# Altium footprint library common.PcbLib: 552 footprints (part 17 of 35)
Each footprint in its own frame and in the unit in brackets; x right, y up, seen from the top. Pads: shape width x height; smd on the part's side, far side on the other; paste and mask are expansions set on the pad; w line width, h text height; cw(c..) or ccw(c..) is an arc to the next point about the centre after c.
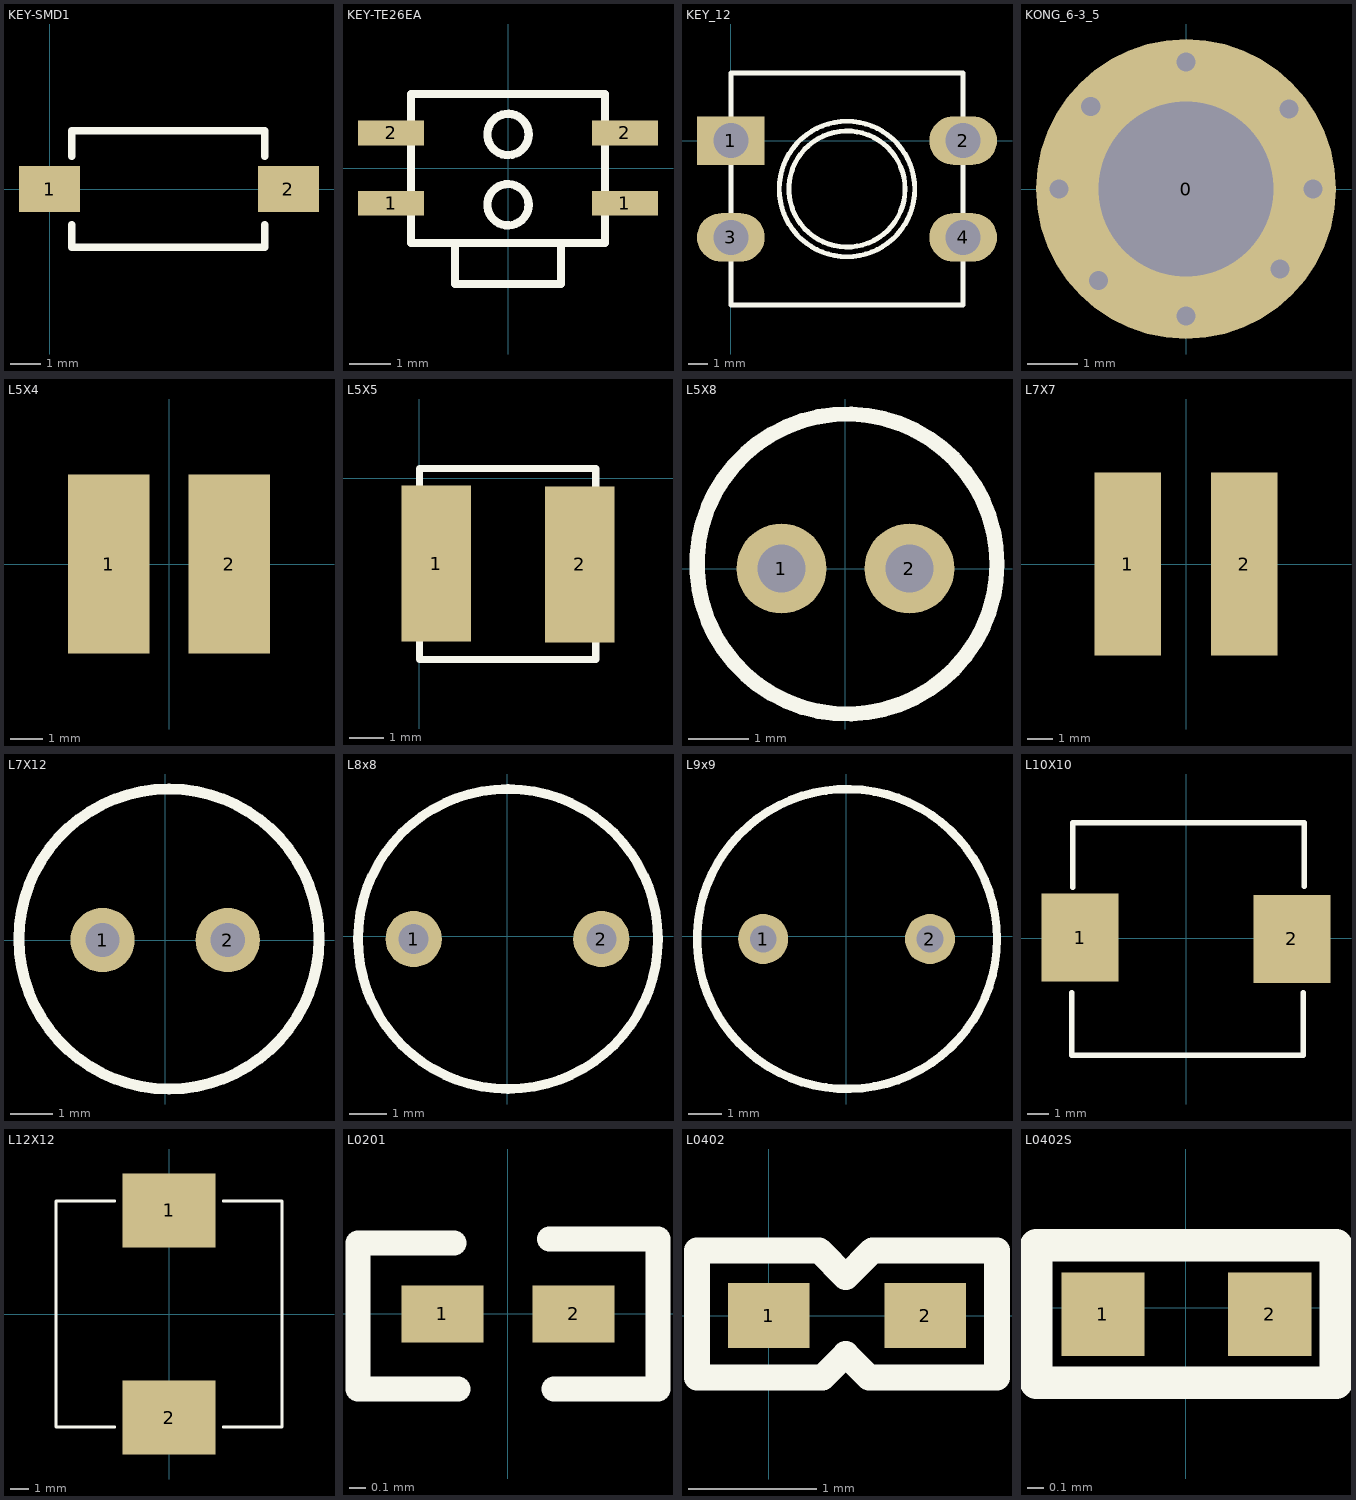
[diagram p16: the footprints below, top view; thin cyan lines are the x and y axes]

## KEY-SMD1 [mm]
pads (2):
  rect 2x1.5 smd: 1(0,0) 2(7.8,0)
Top Overlay:
  lines w0.254: 0.725,-1.168 0.725,-1.9 7.025,-1.9 7.025,-1.168 ; 0.725,1.067 0.725,1.9 7.025,1.9 7.025,1.067
3D body: height 2.5, standoff 0, extent -0.059,-1.945 7.831,1.905

## KEY-TE26EA [mm]
pads (4):
  rect 1.6x0.6 smd: 1(-2.832,-0.851) 1(2.832,-0.851) 2(-2.832,0.851) 2(2.832,0.851)
Top Overlay:
  circle w0.2: c0,-0.889 r0.5
  circle w0.2: c0,0.813 r0.5
  lines w0.2: -1.283,-1.836 -1.283,-2.807 1.283,-2.807 1.283,-1.836 ; -2.349,-1.816 2.349,-1.816 2.349,1.791 -2.349,1.791 -2.349,-1.816
3D body: height 1.63, standoff -0.02, extent -2.941,-2.807 2.959,1.693

## KEY_12 [mm]
pads (4):
  rect 3.5x2.5 hole 1.8: 1(0,0)
  oval 3.5x2.5 hole 1.8: 2(12,0) 3(0,-5) 4(12,-5)
Top Overlay:
  circle w0.254: c6,-2.5 r3.5
  circle w0.254: c6,-2.5 r3
  lines w0.254: 0,-8.5 0,3.5 12,3.5 12,-8.5 0,-8.5
3D body: height 9, standoff -2, extent -0.174,-8.509 12.366,3.491

## KONG_6-3_5 [mm]
height 0.127
pads (1):
  round 6 hole 3.5: 0(0,0)
via 1.88,-1.6 diameter 0.762 hole 0.381
via -1.753,-1.829 diameter 0.762 hole 0.381
via 2.057,1.6 diameter 0.762 hole 0.381
via -1.905,1.651 diameter 0.762 hole 0.381
via 2.54,0 diameter 0.762 hole 0.381
via -2.54,0 diameter 0.762 hole 0.381
via 0,-2.54 diameter 0.762 hole 0.381
via 0,2.54 diameter 0.762 hole 0.381

## L5X4 [mm]
height 4.5
pads (2):
  rect 2.5x5.5 smd: 1(-1.85,0) 2(1.85,0)
3D body: height 4.5, standoff -0.01, extent -2.857,-2.6 2.857,2.6

## L5X5 [mm]
pads (2):
  rect 2x4.5 smd: 1(0.483,-2.464) 2(4.623,-2.489)
Top Overlay:
  lines w0.203: 0,-5.232 5.08,-5.232 5.08,0.279 0,0.279 0,-5.232
3D body: height 2.91, standoff 0, extent 0.065,-4.914 4.965,-0.014

## L5X8 [mm]
pads (2):
  round 1.5 hole 0.8: 1(-1.067,0) 2(1.067,0)
Top Overlay:
  circle w0.254: c0.025,0.076 r2.5
3D body: height 6.5, standoff -28, extent -2.449,-2.424 2.551,2.576

## L7X7 [mm] "POWER INDUCTOR 5uH"
pads (2):
  rect 2.65x7.3 smd: 1(-2.325,0) 2(2.325,0)
3D body: height 2.9, standoff 0, extent -3.36,-3.33 3.34,3.37

## L7X12 [mm]
pads (2):
  round 1.5 hole 0.8: 1(-1.46,0) 2(1.46,0)
Top Overlay:
  circle w0.254: c0.089,0.025 r3.5
3D body: height 10, standoff -25, extent -3.312,-3.274 3.388,3.426

## L8x8 [mm] "L?"
pads (2):
  round 1.5 hole 0.8: 1(-2.489,-0.076) 2(2.515,-0.076)
Top Overlay:
  circle w0.254: c0.025,-0.076 r4
3D body: height 11.2, standoff -5, extent -4.134,-4.236 4.166,4.064

## L9x9 [mm] "L?"
pads (2):
  round 1.5 hole 0.8: 1(-2.489,-0.076) 2(2.515,-0.076)
Top Overlay:
  circle w0.254: c0.025,-0.076 r4.5
3D body: height 11.8, standoff -30, extent -4.526,-4.649 4.474,4.351

## L10X10 [mil]
pads (2):
  rect 140x160 smd: 1(-192.08,1.25) 2(192.08,-1.25)
Top Overlay:
  lines w10: -207.08,-98.75 -207.08,-212.08 212.92,-212.08 212.92,-98.75 ; -205.42,92.92 -205.42,209.58 214.58,209.58 214.58,94.58
3D body: height 157.48, standoff 0, extent -207,-213 215,211

## L12X12 [mm]
pads (2):
  rect 5x4 smd mask+0: 1(0,5.588) 2(0,-5.588)
Top Overlay:
  lines w0.152: -2.921,-6.096 -6.096,-6.096 -6.096,6.096 -5.588,6.096 -2.921,6.096 ; 2.921,-6.096 5.588,-6.096 6.096,-6.096 6.096,6.096 2.921,6.096
3D body: height 4, standoff 0, extent -6.096,-6.096 5.969,6.096

## L0201 [mm] "1/16W"
pads (2):
  rect 0.5x0.35 smd: 1(-0.4,0) 2(0.4,0)
Top Overlay:
  lines w0.152: -0.33,0.432 -0.914,0.432 -0.914,-0.457 -0.305,-0.457 ; 0.254,0.457 0.914,0.457 0.914,-0.457 0.279,-0.457
3D body: height 0.3, standoff 0, extent -0.3,-0.15 0.3,0.15

## L0402 [mil]
pads (2):
  rect 25x20 smd: 1(0,0) 2(48,0)
Top Overlay:
  lines w8: -22,-19 16.43,-19 23.62,-11.81 30.81,-19 70,-19 70,20 31.81,20 23.62,11.81 15.43,20 -22,20 -22,-19
3D body: height 10, standoff 0, extent 8,-10 41,10
3D body: height 10, standoff 0, extent 5,-10 8,10
3D body: height 10, standoff 0, extent 41,-10 44,10

## L0402S [mil] "1/16W"
pads (2):
  rect 20x20 smd: 1(-19.93,-1.58) 2(20.07,-1.58)
Top Overlay:
  lines w7.87: -36,-18 36,-18 36,15 -36,15 -36,-18
3D body: height 10, standoff 0, extent 16.5,-11.58 19.5,8.42
3D body: height 10, standoff 0, extent -19.5,-11.58 -16.5,8.42
3D body: height 10, standoff 0, extent -16.5,-11.58 16.5,8.42